# Altium footprint library LimeMicroAltiumLib_pcbLib.PcbLib: 223 footprints (part 11 of 15)
Each footprint in its own frame and in the unit in brackets; x right, y up, seen from the top. Pads: shape width x height; smd on the part's side, far side on the other; paste and mask are expansions set on the pad; w line width, h text height; cw(c..) or ccw(c..) is an arc to the next point about the centre after c.
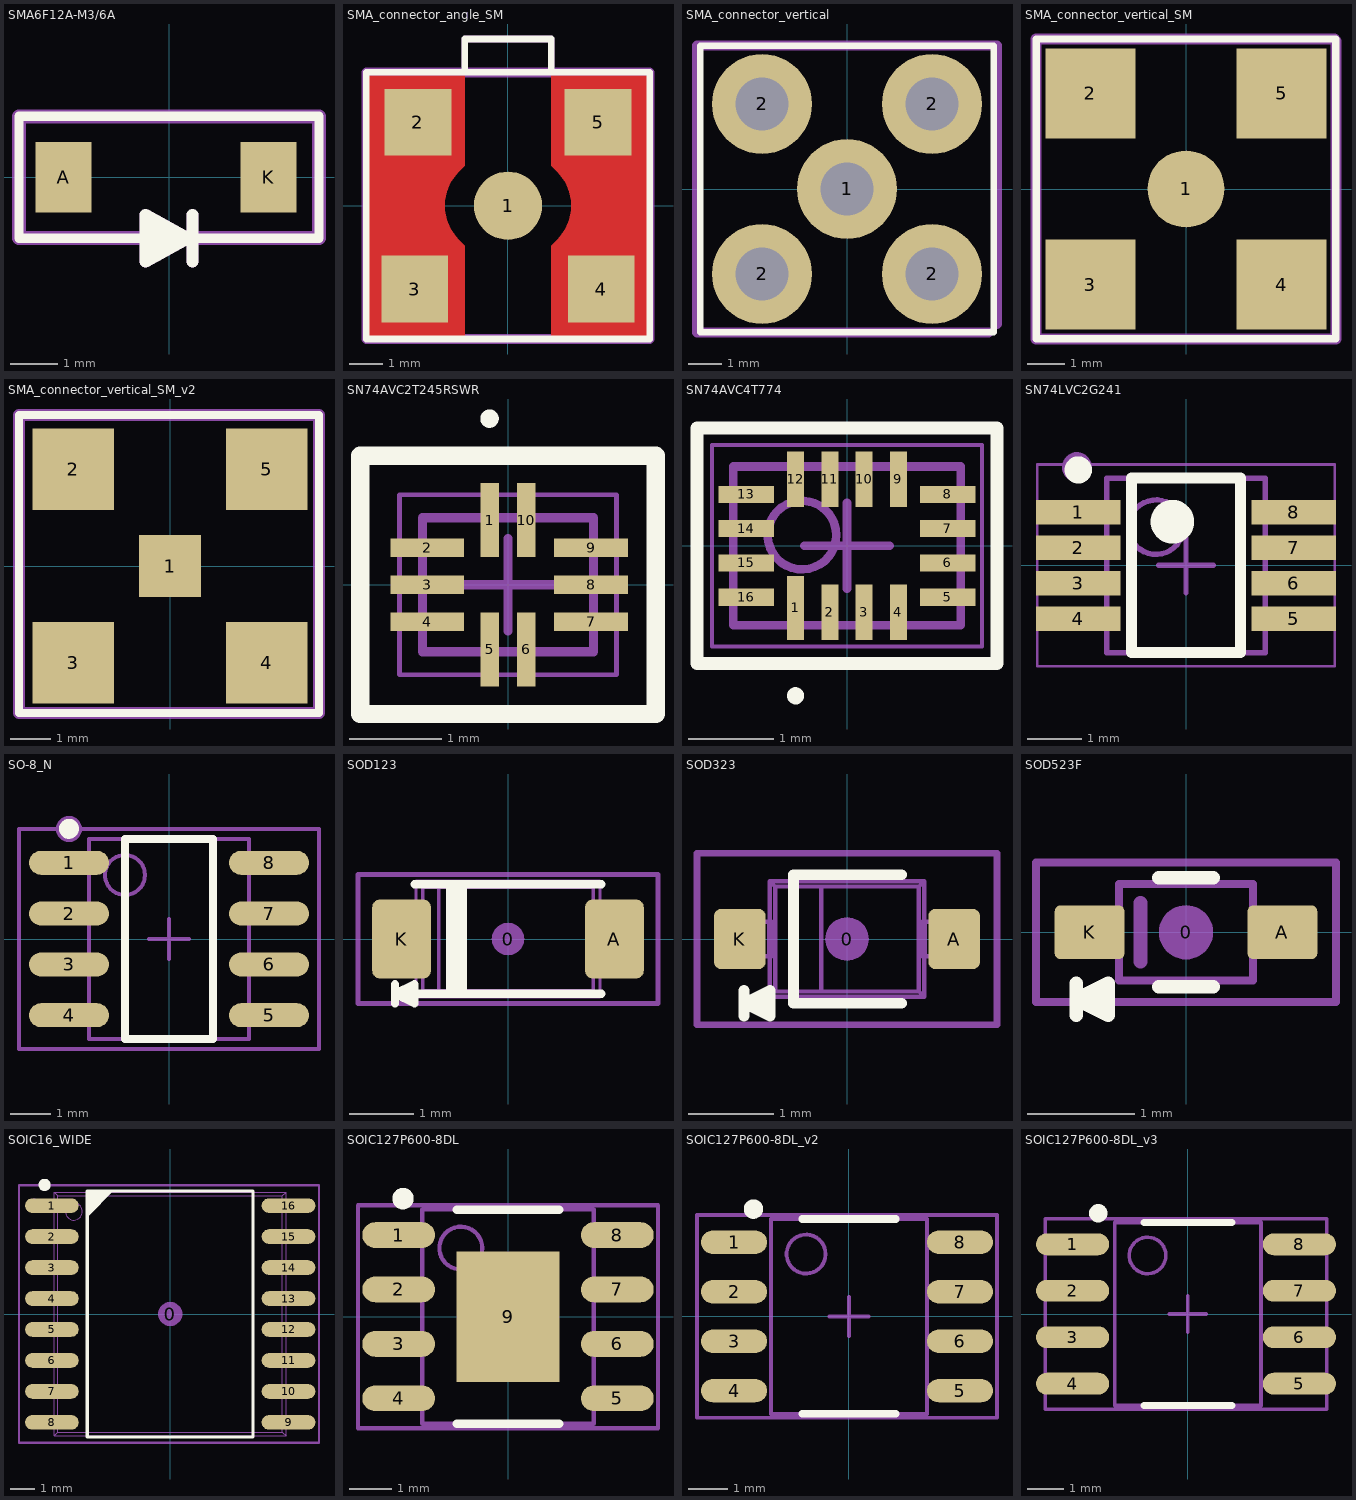
[diagram p10: the footprints below, top view; thin cyan lines are the x and y axes]

## SMA6F12A-M3/6A [mm]
pads (2):
  rect 1.2x1.5 smd: A(-2.25,0) K(2.125,0)
Top Overlay:
  lines w0.2: -3.2,-1.3 3.2,-1.3 3.2,1.3 -3.2,1.3 -3.2,-1.3
  lines w0.254: -0.5,-1.5 -0.1,-1.5 ; -0.5,-1.3 -0.3,-1.3 0.4,-1.3 ; -0.5,-1.1 0,-1.1 ; 0.5,-1.8 0.5,-0.8 ; 0.4,-1.3 -0.5,-0.8 -0.5,-1.8 0.4,-1.3
Mechanical 15:
  lines w0.254: -0.5,-1.5 -0.1,-1.5 ; -0.5,-1.3 -0.3,-1.3 0.4,-1.3 ; -0.5,-1.1 0,-1.1 ; 0.5,-1.8 0.5,-0.8 ; 0.4,-1.3 -0.5,-1.8 -0.5,-0.8 0.4,-1.3
  lines w0.3: -3.2,-1.3 -3.2,1.3 3.2,1.3 3.2,-1.3 -3.2,-1.3
  text "A" at -2.7,-0.8 h1.5
  text "C" at 1.7,-0.8 h1.5
  text ".Designator" at 0,0 h0.7

## SMA_connector_angle_SM [mm]
pads (5):
  round 2.05 smd: 1(0,0)
  rect 2x2 smd: 2(-2.7,2.5) 3(-2.8,-2.5) 4(2.8,-2.5) 5(2.7,2.5)
Top Layer:
  region: 1.3,-3.9 4.2,-3.9 4.2,3.9 1.3,3.9 1.3,1.2 1.476,1.024 1.571,0.919 1.729,0.683 1.838,0.42 1.893,0.142 1.9,0 1.893,-0.142 1.838,-0.42 1.729,-0.683 1.571,-0.919 1.476,-1.024 1.3,-1.2
  region: -1.3,-3.9 -4.2,-3.9 -4.2,3.9 -1.3,3.9 -1.3,1.2 -1.476,1.024 -1.571,0.919 -1.729,0.683 -1.838,0.42 -1.893,0.142 -1.9,0 -1.893,-0.142 -1.838,-0.42 -1.729,-0.683 -1.571,-0.919 -1.476,-1.024 -1.3,-1.2
Top Overlay:
  lines w0.2: -1.3,4 -1.3,5 1.3,5 1.3,4 ; -4.25,-4 -4.25,4 4.25,4 4.25,-4 -4.25,-4
Mechanical 15:
  lines w0.1: -4.25,-4 4.25,-4 4.25,4 -4.25,4 -4.25,-4
  lines w0.2: -1.3,4 -1.3,5 1.3,5 1.3,4
  lines w0.3: -4.25,-4 -4.25,4 4.25,4 4.25,-4 -4.25,-4
  text ".Designator" at 0,0 h0.7
3D body "User Library-Con, 142-0711-201.STEP": height 8.84, standoff 0, extent -3.233,-3.233 3.234,3.234

## SMA_connector_vertical [mm]
pads (5):
  round 3 hole 1.6: 1(0,0) 2(-2.55,-2.55) 2(-2.55,2.55) 2(2.55,-2.55) 2(2.55,2.55)
Top Overlay:
  lines w0.2: -4.4,-4.3 4.4,-4.3 4.4,4.3 -4.4,4.3 -4.4,-4.3
Mechanical 15:
  lines w0.1: -4.25,-4.3 4.25,-4.3 ; 4.5,-4.05 4.5,4
  lines w0.3: 4.25,-4.3 -4.5,-4.3 -4.5,4.3 4.5,4.3 4.5,-4.05
  text ".Designator" at 0,0 h0.7
3D body "User Library-SMA_Stehend_Amp 132134RP-1.STEP": height 9.53, standoff -3.94, extent -3.5,-3.5 3.5,3.5

## SMA_connector_vertical_SM [mm]
pads (5):
  round 2.05 smd: 1(0,0)
  rect 2.4x2.4 smd: 2(-2.55,2.55) 3(-2.55,-2.55) 4(2.55,-2.55) 5(2.55,2.55)
Top Overlay:
  lines w0.2: -4,-4 4,-4 4,4 -4,4 -4,-4
Mechanical 15:
  lines w0.1: -4,4 3.95,4
  lines w0.3: 3.95,4 -4,4 -4,-4 4,-4 4,3.95
  text ".Designator" at 0,0 h0.7
3D body "User Library-Con, 142-0711-201.STEP": height 8.84, standoff 0, extent -3.233,-3.233 3.234,3.234

## SMA_connector_vertical_SM_v2 [mm]
pads (5):
  rect 1.52x1.52 smd: 1(0,0)
  rect 2x2 smd: 2(-2.37,2.37) 3(-2.37,-2.37) 4(2.37,-2.37) 5(2.37,2.37)
Top Overlay:
  lines w0.2: -3.7,-3.6 3.65,-3.6 3.65,3.7 -3.7,3.7 -3.7,-3.6
Mechanical 15:
  lines w0.3: -3.7,-3.6 -3.7,3.7 3.65,3.7 3.65,-3.6 -3.7,-3.6
  text ".Designator" at 0,0 h0.7
3D body "User Library-Con, 142-0711-201.STEP": height 8.84, standoff 0, extent -3.233,-3.233 3.234,3.234

## SN74AVC2T245RSWR [mm] "PQFN, 10-Leads, Body 1,80x1,40mm, Pitch 0,40mm, IPC Medium Density"
height 0.55
pads (10):
  rect 0.2x0.8 smd: 1(-0.2,0.7) 5(-0.2,-0.7) 6(0.2,-0.7) 10(0.2,0.7)
  rect 0.8x0.2 smd: 2(-0.875,0.4) 3(-0.875,0) 4(-0.875,-0.4) 7(0.9,-0.4) 8(0.9,0) 9(0.9,0.4)
Top Overlay:
  circle w0.1: c-0.2,1.8 r0.05
  lines w0.2: -1.6,-1.4 1.6,-1.4 1.6,1.4 -1.6,1.4 -1.6,-1.4
Mechanical 13:
  lines w0.1: -0.925,-0.725 0.925,-0.725 0.925,0.725 -0.925,0.725 -0.925,-0.725
Mechanical 15:
  lines w0.05: -1.175,-0.975 1.175,-0.975 1.175,0.975 -1.175,0.975 -1.175,-0.975
  lines w0.1: -0.5,0 0.5,0 ; 0,-0.5 0,0.5
  text ".Designator" at 0,0 h0.7
3D body: height 0.55, standoff 0, extent -0.925,-0.725 0.925,0.725

## SN74AVC4T774 [mm] "PQFN, 16-Leads, Body 2,60x1,80mm, Pitch 0,40mm, IPC Medium Density"
height 0.55
pads (16):
  rect 0.2x0.75 smd mask+0.05: 1(-0.6,-0.725)
  rect 0.2x0.65 smd mask+0.05: 2(-0.2,-0.775) 3(0.2,-0.775) 4(0.6,-0.775) 9(0.6,0.775) 10(0.2,0.775) 11(-0.2,0.775) 12(-0.6,0.775)
  rect 0.65x0.2 smd mask+0.05: 5(1.175,-0.6) 6(1.175,-0.2) 7(1.175,0.2) 8(1.175,0.6) 13(-1.175,0.6) 14(-1.175,0.2) 15(-1.175,-0.2) 16(-1.175,-0.6)
Top Overlay:
  circle w0.1: c-0.6,-1.75 r0.05
  lines w0.15: -1.75,-1.375 1.75,-1.375 1.75,1.375 -1.75,1.375 -1.75,-1.375
Mechanical 13:
  circle w0.1: c-0.525,0.125 r0.4
  lines w0.1: -1.325,-0.925 1.325,-0.925 1.325,0.925 -1.325,0.925 -1.325,-0.925
Mechanical 15:
  circle w0.1: c-0.6,-0.975 r0.05
  lines w0.05: -1.575,-1.175 1.575,-1.175 1.575,1.175 -1.575,1.175 -1.575,-1.175
  lines w0.1: -0.5,0 0.5,0 ; 0,-0.5 0,0.5
  text ".Designator" at 0,0 h0.7
3D body "User Library-UQFN-16.step": height 0.55, standoff -0.05, extent -1.325,-0.925 1.325,0.925

## SN74LVC2G241 [mm] "TSOP, 8-Leads, Body 2,95x2,80mm, Pitch 0,65mm, IPC Medium Density"
height 1.3
pads (8):
  rect 1.55x0.45 smd mask+0.05: 1(-1.975,0.975) 2(-1.975,0.325) 3(-1.975,-0.325) 4(-1.975,-0.975) 5(1.975,-0.975) 6(1.975,-0.325) 7(1.975,0.325) 8(1.975,0.975)
Top Overlay:
  circle w0.4: c-0.25,0.8 r0.2
  circle w0.25: c-1.975,1.75 r0.125
  lines w0.2: -1,-1.6 1,-1.6 1,1.6 -1,1.6 -1,-1.6
Mechanical 13:
  circle w0.1: c-0.55,0.7 r0.5
  lines w0.1: -1.45,-1.6 1.45,-1.6 1.45,1.6 -1.45,1.6 -1.45,-1.6
Mechanical 15:
  circle w0.35: c-2,1.8 r0.1
  lines w0.05: -2.725,-1.85 2.725,-1.85 2.725,1.85 -2.725,1.85 -2.725,-1.85
  lines w0.1: -0.5,0 0.5,0 ; 0,-0.5 0,0.5
  text ".Designator" at 0,0 h0.7
3D body: height 1.3, standoff 0.1, extent -1.45,-1.6 1.45,1.6

## SO-8_N [mm] "SOIC, 8-Leads, Body 4.9x3.9mm, Pitch 1.27mm, IPC Medium Density"
height 1.75
pads (8):
  oval 2x0.6 smd: 1(-2.5,1.905) 2(-2.5,0.635) 3(-2.5,-0.635) 4(-2.5,-1.905) 5(2.5,-1.905) 6(2.5,-0.635) 7(2.5,0.635) 8(2.5,1.905)
Top Overlay:
  circle w0.25: c-2.5,2.755 r0.125
  lines w0.2: -1.1,-2.5 -1.1,2.5 1.1,2.5 1.1,-2.5 -1.1,-2.5
Mechanical 13:
  circle w0.1: c-1.1,1.6 r0.5
  lines w0.1: -2,-2.5 -2,2.5 2,2.5 2,-2.5 -2,-2.5
Mechanical 15:
  circle w0.35: c-2.5,2.75 r0.15
  lines w0.1: -0.5,0 0.5,0 ; 0,-0.5 0,0.5 ; -3.75,-2.75 -3.75,2.75 3.75,2.75 3.75,-2.75 -3.75,-2.75
  text ".Designator" at 0,0 h0.7
3D body "CircuitWorks-SO-8.step": height 1.45, standoff 0, extent -2.889,-2.452 2.889,2.45

## SOD123 [mm] "SOD-123; 2 Leads; Body 2.7 x 1.6 mm, (LxW)"
height 1.35
pads (3):
  round 0.508 on Mech15: 0(0,0)
  rrect25% 0.91x1.22 smd: A(1.65,0) K(-1.65,0)
Top Overlay:
  lines w0.127: -1.75,-1 -1.75,-0.7 ; -1.45,0.85 1.45,0.85 ; -0.9,-0.85 -0.9,0.85 ; -0.8,-0.85 -0.8,0.85 ; -0.7,-0.85 -0.7,0.85 ; 1.448,-0.85 -1.45,-0.85 -1.75,-0.85 ; -1.75,-0.85 -1.45,-1 -1.45,-0.7 -1.75,-0.85
Mechanical 13:
  lines w0.05: -1.766,-0.308 -1.766,0.308 ; -1.707,-0.308 -1.707,0.308 ; -1.517,-0.308 -1.517,0.308 ; -1.425,-0.308 -1.95,-0.308 -1.95,0.308 -1.425,0.308 ; 1.425,-0.308 1.95,-0.308 1.95,0.308 1.425,0.308 ; 1.517,-0.308 1.517,0.308 ; 1.707,-0.308 1.707,0.308 ; 1.766,-0.308 1.766,0.308 ; -1.425,-0.9 1.425,-0.9 ; -1.425,-0.9 -1.323,-0.798 ; -1.425,-0.9 -1.425,0.9 ; -1.425,0.9 -1.323,0.798 ; -1.425,0.9 1.425,0.9 ; -1.323,-0.798 -1.072,-0.798 ; -1.323,-0.798 -1.323,0.798 ; -1.323,0.798 -1.072,0.798 ; -1.072,-0.798 1.322,-0.797 ; -1.072,-0.798 -1.072,0.798 ; -1.072,0.798 1.322,0.797 ; 1.322,-0.797 1.322,0.797 ; 1.322,-0.797 1.425,-0.9 ; 1.322,0.797 1.425,0.9 ; 1.425,-0.9 1.425,0.9
Mechanical 15:
  lines w0.076: -2.325,-1 2.325,-1 2.325,1 -2.325,1 -2.325,-1
  text ".Designator" at 0,0 h0.7
3D body "SOD123.STEP": height 1.18, standoff 0, extent -1.95,-0.9 1.95,0.9

## SOD323 [mm] "SOD-323; 2 Leads; Body 1.8 x 1.35 mm, (LxW)"
height 1.15
pads (3):
  round 0.508 on Mech15: 0(0,0)
  rrect25% 0.6x0.7 smd: A(1.25,0) K(-1.25,0)
Top Overlay:
  lines w0.127: -1.2,-0.9 -1.2,-0.6 ; -0.9,-0.75 -1.2,-0.75 ; 0.635,-0.75 -0.625,-0.75 -0.625,0.75 0.635,0.75 ; -1.2,-0.75 -0.9,-0.6 -0.9,-0.9 -1.2,-0.75
Mechanical 13:
  lines w0.05: -1.157,-0.2 -1.157,0.2 ; -1.11,-0.2 -1.11,0.2 ; -0.91,-0.2 -0.91,0.2 ; -0.9,-0.2 -0.9,-0.675 ; -0.9,0.2 -0.9,0.675 ; 0.9,-0.2 0.9,-0.675 ; 0.9,0.2 0.9,0.675 ; 0.91,-0.2 0.91,0.2 ; 1.11,-0.2 1.11,0.2 ; 1.157,-0.2 1.157,0.2 ; -0.9,-0.675 0.9,-0.675 ; -0.9,-0.675 -0.838,-0.613 ; -0.9,0.675 -0.838,0.613 ; -0.9,0.675 0.9,0.675 ; -0.838,-0.613 -0.3,-0.613 ; -0.838,-0.613 -0.838,0.613 ; -0.838,0.613 -0.3,0.613 ; -0.3,-0.613 0.838,-0.613 ; -0.3,-0.613 -0.3,0.613 ; -0.3,0.613 0.838,0.613 ; 0.838,-0.613 0.9,-0.675 ; 0.838,-0.613 0.838,0.613 ; 0.838,0.613 0.9,0.675 ; -1.3,-0.2 -0.879,-0.2 -0.879,0.2 -1.3,0.2 -1.3,-0.2 ; 0.879,-0.2 0.879,0.2 1.3,0.2 1.3,-0.2 0.879,-0.2
Mechanical 15:
  lines w0.076: -1.75,-1 1.75,-1 1.75,1 -1.75,1 -1.75,-1
  text ".Designator" at 0,0 h0.7
3D body "SOD323.STEP": height 1.1, standoff 0, extent -1.3,-0.675 1.3,0.675

## SOD523F [mm] "SOD-523F; 2 Leads; Body 1.3 x 0.9 mm, (LxW)"
height 0.7
pads (3):
  round 0.508 on Mech15: 0(0,0)
  rrect20% 0.65x0.5 smd: A(0.9,0) K(-0.9,0)
Top Overlay:
  lines w0.127: -1.025,-0.775 -1.025,-0.475 ; -0.725,-0.625 -1.025,-0.625 ; -0.254,-0.508 0.254,-0.508 ; -0.254,0.508 0.254,0.508 ; -1.025,-0.625 -0.725,-0.475 -0.725,-0.775 -1.025,-0.625
Mechanical 13:
  lines w0.076: -0.625,-0.175 -0.85,-0.175 -0.85,0.175 -0.625,0.175 ; -0.625,-0.175 -0.625,-0.45 0.625,-0.45 0.625,-0.175 ; -0.625,-0.175 -0.625,0.175 ; -0.625,0.175 -0.625,0.45 0.625,0.45 0.625,0.175 ; 0.625,-0.175 0.85,-0.175 0.85,0.175 0.625,0.175 ; 0.625,-0.175 0.625,0.175
  lines w0.127: -0.425,-0.275 -0.425,0.275
Mechanical 15:
  lines w0.076: -1.4,-0.65 -1.4,0.65 1.4,0.65 1.4,-0.65 -1.4,-0.65
  text ".Designator" at 0,0 h0.7
3D body "SOD-523F.STEP": height 0.7, standoff 0, extent -0.85,-0.45 0.85,0.45

## SOIC16_WIDE [mm] "SOIC, 1.27mm pitch, 16 pin"
height 1.75
pads (17):
  round 1 on Mech15: 0(0,0)
  oval 2.2x0.6 smd: 1(-4.85,4.445) 2(-4.85,3.175) 3(-4.85,1.905) 4(-4.85,0.635) 5(-4.85,-0.635) 6(-4.85,-1.905) 7(-4.85,-3.175) 8(-4.85,-4.445) 9(4.85,-4.445) 10(4.85,-3.175) 11(4.85,-1.905) 12(4.85,-0.635) 13(4.85,0.635) 14(4.85,1.905) 15(4.85,3.175) 16(4.85,4.445)
Top Overlay:
  circle w0.25: c-5.15,5.295 r0.125
  region: -3.35,5.035 -2.35,5.035 -3.35,4.035
  lines w0.127: -3.4,-5.035 -3.4,5.035 3.4,5.035 3.4,-5.035 -3.4,-5.035
Mechanical 13:
  circle w0.05: c-3.95,4.2 r0.35
  lines w0.05: -5.381,-4.655 -5.381,-4.235 ; -5.381,-3.385 -5.381,-2.965 ; -5.381,-2.115 -5.381,-1.695 ; -5.381,-0.845 -5.381,-0.425 ; -5.381,0.425 -5.381,0.845 ; -5.381,1.695 -5.381,2.115 ; -5.381,2.965 -5.381,3.385 ; -5.381,4.235 -5.381,4.655 ; -5.293,-4.655 -5.293,-4.235 ; -5.293,-3.385 -5.293,-2.965 ; -5.293,-2.115 -5.293,-1.695 ; -5.293,-0.845 -5.293,-0.425 ; -5.293,0.425 -5.293,0.845 ; -5.293,1.695 -5.293,2.115 ; -5.293,2.965 -5.293,3.385 ; -5.293,4.235 -5.293,4.655 ; -5.153,-4.655 -5.153,-4.235 ; -5.153,-3.385 -5.153,-2.965 ; -5.153,-2.115 -5.153,-1.695 ; -5.153,-0.845 -5.153,-0.425 ; -5.153,0.425 -5.153,0.845 ; -5.153,1.695 -5.153,2.115 ; -5.153,2.965 -5.153,3.385 ; -5.153,4.235 -5.153,4.655 ; -4.863,-4.655 -4.863,-4.235 ; -4.863,-3.385 -4.863,-2.965 ; -4.863,-2.115 -4.863,-1.695 ; -4.863,-0.845 -4.863,-0.425 ; -4.863,0.425 -4.863,0.845 ; -4.863,1.695 -4.863,2.115 ; -4.863,2.965 -4.863,3.385 ; -4.863,4.235 -4.863,4.655 ; -4.75,-4.655 -5.75,-4.655 -5.75,-4.235 -4.75,-4.235 ; -4.75,-3.385 -5.75,-3.385 -5.75,-2.965 -4.75,-2.965 ; -4.75,-2.115 -5.75,-2.115 -5.75,-1.695 -4.75,-1.695 ; -4.75,-0.845 -5.75,-0.845 -5.75,-0.425 -4.75,-0.425 ; -4.75,0.425 -5.75,0.425 -5.75,0.845 -4.75,0.845 ; -4.75,1.695 -5.75,1.695 -5.75,2.115 -4.75,2.115 ; -4.75,2.965 -5.75,2.965 -5.75,3.385 -4.75,3.385 ; -4.75,4.235 -5.75,4.235 -5.75,4.655 -4.75,4.655 ; 4.75,-4.655 5.75,-4.655 5.75,-4.235 4.75,-4.235 ; 4.75,-3.385 5.75,-3.385 5.75,-2.965 4.75,-2.965 ; 4.75,-2.115 5.75,-2.115 5.75,-1.695 4.75,-1.695 ; 4.75,-0.845 5.75,-0.845 5.75,-0.425 4.75,-0.425 ; 4.75,0.425 5.75,0.425 5.75,0.845 4.75,0.845 ; 4.75,1.695 5.75,1.695 5.75,2.115 4.75,2.115 ; 4.75,2.965 5.75,2.965 5.75,3.385 4.75,3.385 ; 4.75,4.235 5.75,4.235 5.75,4.655 4.75,4.655 ; 4.863,-4.655 4.863,-4.235 ; 4.863,-3.385 4.863,-2.965 ; 4.863,-2.115 4.863,-1.695 ; 4.863,-0.845 4.863,-0.425 ; 4.863,0.425 4.863,0.845 ; 4.863,1.695 4.863,2.115 ; 4.863,2.965 4.863,3.385 ; 4.863,4.235 4.863,4.655 ; 5.153,-4.655 5.153,-4.235 ; 5.153,-3.385 5.153,-2.965 ; 5.153,-2.115 5.153,-1.695 ; 5.153,-0.845 5.153,-0.425 ; 5.153,0.425 5.153,0.845 ; 5.153,1.695 5.153,2.115 ; 5.153,2.965 5.153,3.385 ; 5.153,4.235 5.153,4.655 ; 5.293,-4.655 5.293,-4.235 ; 5.293,-3.385 5.293,-2.965 ; 5.293,-2.115 5.293,-1.695 ; 5.293,-0.845 5.293,-0.425 ; 5.293,0.425 5.293,0.845 ; 5.293,1.695 5.293,2.115 ; 5.293,2.965 5.293,3.385 ; 5.293,4.235 5.293,4.655 ; 5.381,-4.655 5.381,-4.235 ; 5.381,-3.385 5.381,-2.965 ; 5.381,-2.115 5.381,-1.695 ; 5.381,-0.845 5.381,-0.425 ; 5.381,0.425 5.381,0.845 ; 5.381,1.695 5.381,2.115 ; 5.381,2.965 5.381,3.385 ; 5.381,4.235 5.381,4.655 ; -4.75,-5 -4.75,5 ; -4.75,-5 -4.601,-4.851 ; -4.75,-5 4.75,-5 ; -4.75,5 -4.601,4.851 ; -4.75,5 4.75,5 ; -4.601,-4.851 -4.601,4.851 ; -4.601,-4.851 4.601,-4.851 ; -4.601,4.851 4.601,4.851 ; 4.601,-4.851 4.75,-5 ; 4.601,-4.851 4.601,4.851 ; 4.601,4.851 4.75,5 ; 4.75,-5 4.75,5
Mechanical 15:
  circle w0.254: c-5.575,4.475 r0.125
  lines w0.1: -6.2,-5.285 -6.2,5.285 6.1,5.285 6.1,-5.285 -6.2,-5.285
  text ".Designator" at 0,0 h0.7
3D body "User Library-SOIC16_Wide_JEDEC_MS-013AA.step": height 2.59, standoff -0.06, extent -5.315,-5.25 5.315,5.25

## SOIC127P600-8DL [mm] "8-Pin Small Outline Integrated Circuit 1.27 mm Pitch"
height 1.55
pads (9):
  oval 1.7x0.6 smd: 1(-2.55,1.905) 2(-2.55,0.635) 3(-2.55,-0.635) 4(-2.55,-1.905) 5(2.55,-1.905) 6(2.55,-0.635) 7(2.55,0.635) 8(2.55,1.905)
  rect 2.4x3.05 smd: 9(0,0)
Top Overlay:
  circle w0.25: c-2.45,2.755 r0.125
  lines w0.2: -1.2,-2.5 1.2,-2.5 ; -1.2,2.5 1.2,2.5
Mechanical 13:
  circle w0.1: c-1.1,1.6 r0.5
  lines w0.1: -2,-2.5 -2,2.5 2,2.5 2,-2.5 -2,-2.5
Mechanical 15:
  circle w0.35: c-2.6,1.9 r0.1
  lines w0.1: -0.5,0 0.5,0 ; 0,-0.5 0,0.5 ; -3.5,-2.6 -3.5,2.6 3.5,2.6 3.5,-2.6 -3.5,-2.6
  text ".Designator" at 0,0 h0.7
3D body "SOIC-8.STEP": height 1.75, standoff 0, extent -3,-2.45 3,2.45

## SOIC127P600-8DL_v2 [mm] "8-Pin Small Outline Integrated Circuit 1.27 mm Pitch"
height 1.55
pads (8):
  oval 1.7x0.6 smd: 1(-2.95,1.905) 2(-2.95,0.635) 3(-2.95,-0.635) 4(-2.95,-1.905) 5(2.85,-1.905) 6(2.85,-0.635) 7(2.85,0.635) 8(2.85,1.905)
Top Overlay:
  circle w0.25: c-2.45,2.755 r0.125
  lines w0.2: -1.2,-2.5 1.2,-2.5 ; -1.2,2.5 1.2,2.5
Mechanical 13:
  circle w0.1: c-1.1,1.6 r0.5
  lines w0.1: -2,-2.5 2,-2.5 2,2.5 -2,2.5 -2,-2.5
Mechanical 15:
  circle w0.35: c-3.1,1.9 r0.1
  lines w0.1: -0.5,0 0.5,0 ; 0,-0.5 0,0.5 ; -3.9,-2.6 3.8,-2.6 3.8,2.6 -3.9,2.6 -3.9,-2.6
  text ".Designator" at 0,0 h0.7
3D body "SOIC-8.STEP": height 1.75, standoff 0, extent -3,-2.45 3,2.45

## SOIC127P600-8DL_v3 [mm] "8-Pin Small Outline Integrated Circuit 1.27 mm Pitch"
height 1.55
pads (8):
  oval 2x0.6 smd: 1(-3.15,1.905) 2(-3.15,0.635) 3(-3.15,-0.635) 4(-3.15,-1.905) 5(3.05,-1.905) 6(3.05,-0.635) 7(3.05,0.635) 8(3.05,1.905)
Top Overlay:
  circle w0.25: c-2.45,2.755 r0.125
  lines w0.2: -1.2,-2.5 1.2,-2.5 ; -1.2,2.5 1.2,2.5
Mechanical 13:
  circle w0.1: c-1.1,1.6 r0.5
  lines w0.1: -2,-2.5 -2,2.5 2,2.5 2,-2.5 -2,-2.5
Mechanical 15:
  circle w0.35: c-3.1,1.9 r0.1
  lines w0.1: -0.5,0 0.5,0 ; 0,-0.5 0,0.5 ; -3.9,-2.6 -3.9,2.6 3.8,2.6 3.8,-2.6 -3.9,-2.6
  text ".Designator" at 0,0 h0.7
3D body "SOIC-8.STEP": height 1.75, standoff 0, extent -3,-2.45 3,2.45